# Altium footprint library AltiumDesignerLibraries.PcbLib: 313 footprints (part 17 of 20)
Each footprint in its own frame and in the unit in brackets; x right, y up, seen from the top. Pads: shape width x height; smd on the part's side, far side on the other; paste and mask are expansions set on the pad; w line width, h text height; cw(c..) or ccw(c..) is an arc to the next point about the centre after c.
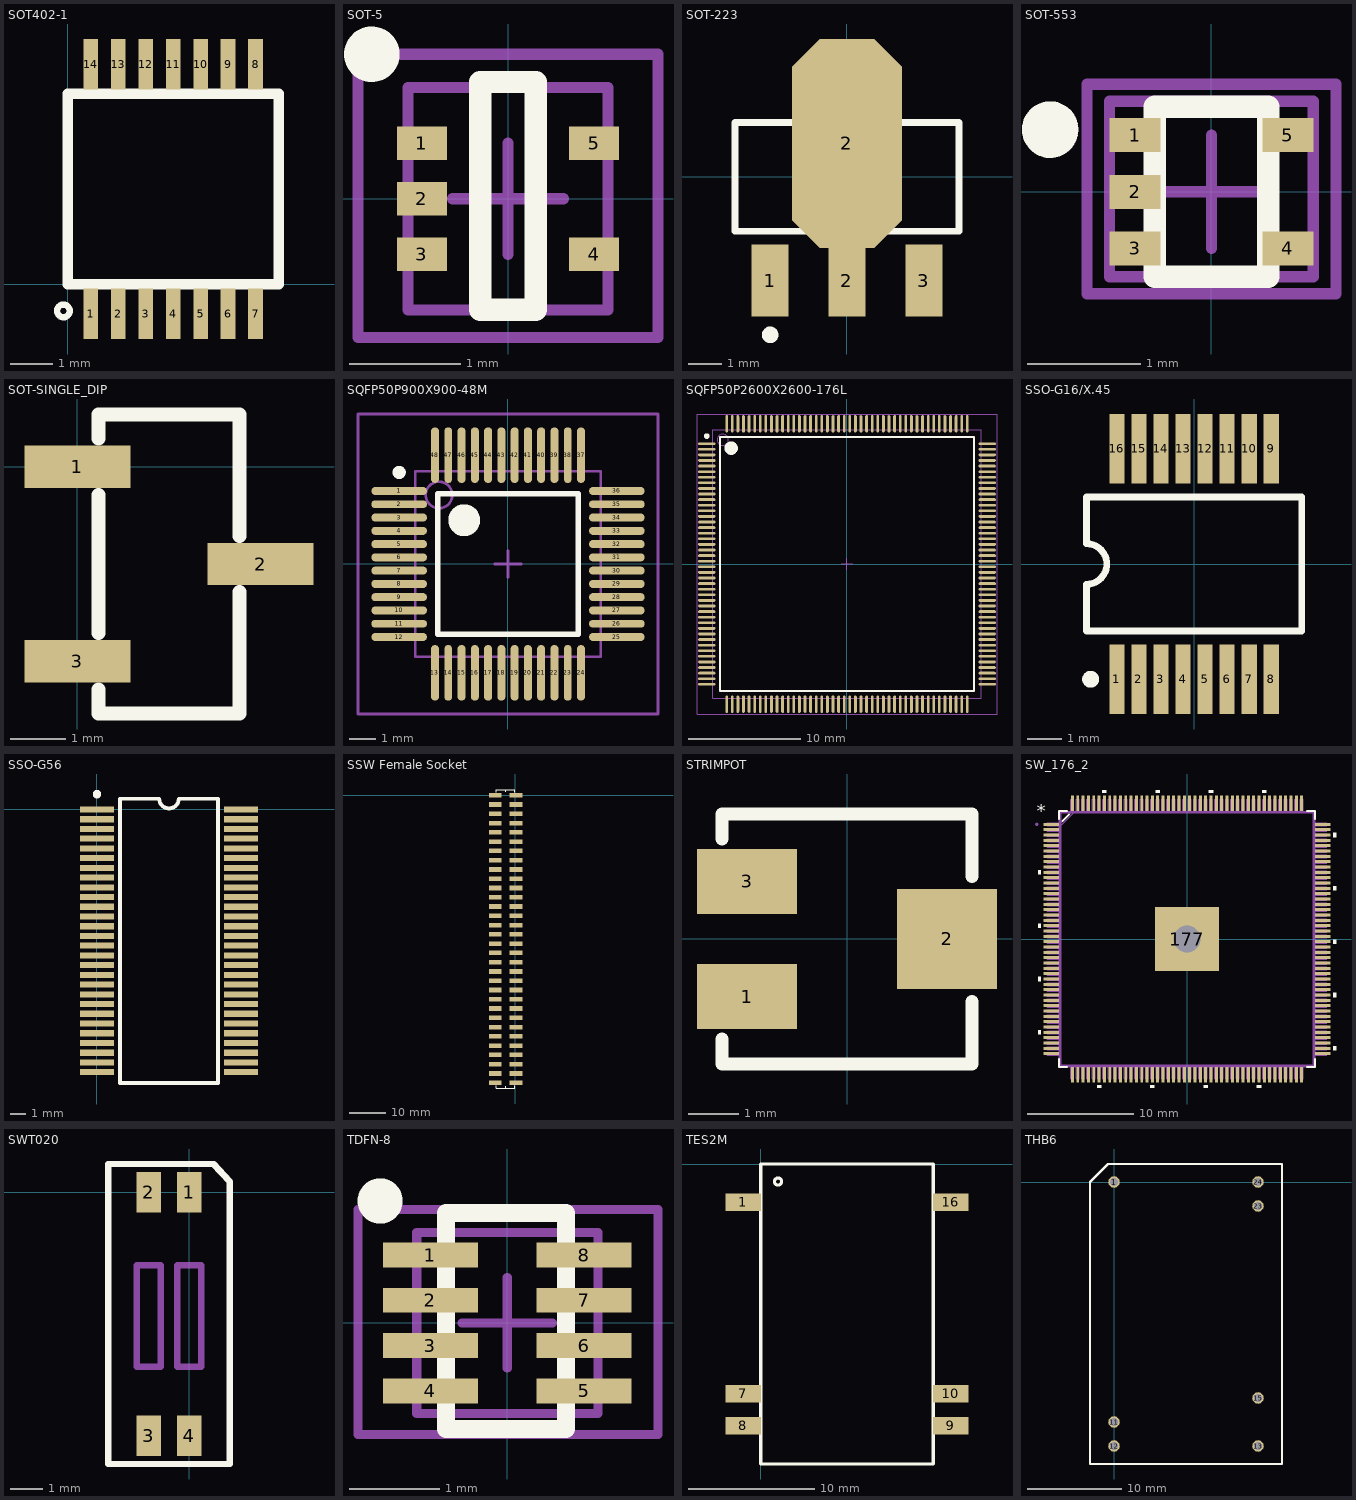
[diagram p16: the footprints below, top view; thin cyan lines are the x and y axes]

## SOT402-1 [mm]
pads (14):
  rect 0.35x1.2 smd: 1(0.55,-0.7) 2(1.2,-0.7) 3(1.85,-0.7) 4(2.5,-0.7) 5(3.15,-0.7) 6(3.8,-0.7) 7(4.45,-0.7) 8(4.45,5.2) 9(3.8,5.2) 10(3.15,5.2) 11(2.5,5.2) 12(1.85,5.2) 13(1.2,5.2) 14(0.55,5.2)
Top Overlay:
  circle w0.15: c-0.099,-0.635 r0.15
  lines w0.25: 0,0 5,0 5,4.5 0,4.5 0,0

## SOT-5 [mm] "SOT23, 5-Leads, Body 2.9x1.6mm, Pitch 0.95mm, Lead Span 2.8mm, IPC Medium Density"
height 0.6
pads (5):
  rect 0.45x0.3 smd: 1(-0.775,0.5) 2(-0.775,0) 3(-0.775,-0.5) 4(0.775,-0.5) 5(0.775,0.5)
Top Overlay:
  circle w0.25: c-1.225,1.3 r0.125
  lines w0.2: -0.25,-1 0.25,-1 0.25,1.05 -0.25,1.05 -0.25,-1
Mechanical 13:
  lines w0.1: -0.9,-1 0.9,-1 0.9,1 -0.9,1 -0.9,-1
Mechanical 15:
  lines w0.1: -0.5,0 0.5,0 ; 0,-0.5 0,0.5 ; -1.35,-1.25 -1.35,1.3 1.35,1.3 1.35,-1.25 -1.35,-1.25
3D body: height 0.6, standoff 0, extent -0.9,-1 0.9,1

## SOT-223 [mm]
pads (4):
  rect 1.1x2.15 smd: 1(-2.3,-3.1) 2(0,-3.1) 3(2.3,-3.1)
  oct 3.3x6.25 smd: 2(0,1)
Top Overlay:
  circle w0.25: c-2.3,-4.725 r0.125
  lines w0.2: -3.35,-1.625 -3.35,1.625 3.35,1.625 3.35,-1.625 -3.35,-1.625

## SOT-553 [mm] "SOT-553"
height 0.5
pads (5):
  rect 0.45x0.3 smd: 1(-0.675,0.5) 2(-0.675,0) 3(-0.675,-0.5) 4(0.675,-0.5) 5(0.675,0.5)
Top Overlay:
  circle w0.25: c-1.425,0.55 r0.125
  lines w0.2: -0.5,-0.75 -0.5,0.75 0.5,0.75 0.5,-0.75 -0.5,-0.75
Mechanical 13:
  lines w0.1: -0.9,-0.75 0.9,-0.75 0.9,0.8 -0.9,0.8 -0.9,-0.75
Mechanical 15:
  lines w0.1: -0.5,0 0.5,0 ; 0,-0.5 0,0.5 ; -1.1,-0.9 1.1,-0.9 1.1,0.95 -1.1,0.95 -1.1,-0.9
3D body: height 1.45, standoff 0, extent -0.9,-0.8 0.9,0.85

## SOT-SINGLE_DIP [mil] "Mini-Dip switch"
pads (3):
  rect 75x30 smd: 1(0,0) 2(130,-69) 3(0,-138)
Top Overlay:
  lines w10: 15,-158 15,-175 115,-175 115,-89 ; 15,-118 15,-20 ; 15,20 15,37 115,37 115,-49

## SQFP50P900X900-48M [mm] "Shrink QFP, 48-Leads, Body 7x7mm, Pitch 0.5mm, IPC Low Density"
height 1.7
pads (48):
  oval 2.1x0.3 smd: 1(-4.1,2.75) 2(-4.1,2.25) 3(-4.1,1.75) 4(-4.1,1.25) 5(-4.1,0.75) 6(-4.1,0.25) 7(-4.1,-0.25) 8(-4.1,-0.75) 9(-4.1,-1.25) 10(-4.1,-1.75) 11(-4.1,-2.25) 12(-4.1,-2.75) 25(4.1,-2.75) 26(4.1,-2.25) 27(4.1,-1.75) 28(4.1,-1.25) 29(4.1,-0.75) 30(4.1,-0.25) 31(4.1,0.25) 32(4.1,0.75) 33(4.1,1.25) 34(4.1,1.75) 35(4.1,2.25) 36(4.1,2.75)
  oval 0.3x2.1 smd: 13(-2.75,-4.1) 14(-2.25,-4.1) 15(-1.75,-4.1) 16(-1.25,-4.1) 17(-0.75,-4.1) 18(-0.25,-4.1) 19(0.25,-4.1) 20(0.75,-4.1) 21(1.25,-4.1) 22(1.75,-4.1) 23(2.25,-4.1) 24(2.75,-4.1) 37(2.75,4.1) 38(2.25,4.1) 39(1.75,4.1) 40(1.25,4.1) 41(0.75,4.1) 42(0.25,4.1) 43(-0.25,4.1) 44(-0.75,4.1) 45(-1.25,4.1) 46(-1.75,4.1) 47(-2.25,4.1) 48(-2.75,4.1)
Top Overlay:
  circle w0.25: c-4.1,3.45 r0.125
  circle w0.6: c-1.65,1.65 r0.3
  lines w0.2: -2.65,-2.65 -2.65,2.65 2.65,2.65 2.65,-2.65 -2.65,-2.65
Mechanical 13:
  circle w0.1: c-2.6,2.6 r0.5
  lines w0.1: -3.5,-3.5 -3.5,3.5 3.5,3.5 3.5,-3.5 -3.5,-3.5
Mechanical 15:
  lines w0.1: -0.5,0 0.5,0 ; 0,-0.5 0,0.5 ; -5.65,-5.65 -5.65,5.65 5.65,5.65 5.65,-5.65 -5.65,-5.65
3D body: height 1.7, standoff 0, extent -3.5,-3.5 3.5,3.5

## SQFP50P2600X2600-176L [mm] "Shrink QFP, 176-Leads, Body 24x24mm, Pitch 0.5mm, IPC High Density"
height 3.2
pads (176):
  oval 1.55x0.25 smd: 1(-12.525,10.75) 2(-12.525,10.25) 3(-12.525,9.75) 4(-12.525,9.25) 5(-12.525,8.75) 6(-12.525,8.25) 7(-12.525,7.75) 8(-12.525,7.25) 9(-12.525,6.75) 10(-12.525,6.25) 11(-12.525,5.75) 12(-12.525,5.25) 13(-12.525,4.75) 14(-12.525,4.25) 15(-12.525,3.75) 16(-12.525,3.25) 17(-12.525,2.75) 18(-12.525,2.25) 19(-12.525,1.75) 20(-12.525,1.25) 21(-12.525,0.75) 22(-12.525,0.25) 23(-12.525,-0.25) 24(-12.525,-0.75) 25(-12.525,-1.25) 26(-12.525,-1.75) 27(-12.525,-2.25) 28(-12.525,-2.75) 29(-12.525,-3.25) 30(-12.525,-3.75) 31(-12.525,-4.25) 32(-12.525,-4.75) 33(-12.525,-5.25) 34(-12.525,-5.75) 35(-12.525,-6.25) 36(-12.525,-6.75) 37(-12.525,-7.25) 38(-12.525,-7.75) 39(-12.525,-8.25) 40(-12.525,-8.75) 41(-12.525,-9.25) 42(-12.525,-9.75) 43(-12.525,-10.25) 44(-12.525,-10.75) 89(12.525,-10.75) 90(12.525,-10.25) 91(12.525,-9.75) 92(12.525,-9.25) 93(12.525,-8.75) 94(12.525,-8.25) 95(12.525,-7.75) 96(12.525,-7.25) 97(12.525,-6.75) 98(12.525,-6.25) 99(12.525,-5.75) 100(12.525,-5.25) 101(12.525,-4.75) 102(12.525,-4.25) 103(12.525,-3.75) 104(12.525,-3.25) 105(12.525,-2.75) 106(12.525,-2.25) 107(12.525,-1.75) 108(12.525,-1.25) 109(12.525,-0.75) 110(12.525,-0.25) 111(12.525,0.25) 112(12.525,0.75) 113(12.525,1.25) 114(12.525,1.75) 115(12.525,2.25) 116(12.525,2.75) 117(12.525,3.25) 118(12.525,3.75) 119(12.525,4.25) 120(12.525,4.75) 121(12.525,5.25) 122(12.525,5.75) 123(12.525,6.25) 124(12.525,6.75) 125(12.525,7.25) 126(12.525,7.75) 127(12.525,8.25) 128(12.525,8.75) 129(12.525,9.25) 130(12.525,9.75) 131(12.525,10.25) 132(12.525,10.75)
  oval 0.25x1.55 smd: 45(-10.75,-12.525) 46(-10.25,-12.525) 47(-9.75,-12.525) 48(-9.25,-12.525) 49(-8.75,-12.525) 50(-8.25,-12.525) 51(-7.75,-12.525) 52(-7.25,-12.525) 53(-6.75,-12.525) 54(-6.25,-12.525) 55(-5.75,-12.525) 56(-5.25,-12.525) 57(-4.75,-12.525) 58(-4.25,-12.525) 59(-3.75,-12.525) 60(-3.25,-12.525) 61(-2.75,-12.525) 62(-2.25,-12.525) 63(-1.75,-12.525) 64(-1.25,-12.525) 65(-0.75,-12.525) 66(-0.25,-12.525) 67(0.25,-12.525) 68(0.75,-12.525) 69(1.25,-12.525) 70(1.75,-12.525) 71(2.25,-12.525) 72(2.75,-12.525) 73(3.25,-12.525) 74(3.75,-12.525) 75(4.25,-12.525) 76(4.75,-12.525) 77(5.25,-12.525) 78(5.75,-12.525) 79(6.25,-12.525) 80(6.75,-12.525) 81(7.25,-12.525) 82(7.75,-12.525) 83(8.25,-12.525) 84(8.75,-12.525) 85(9.25,-12.525) 86(9.75,-12.525) 87(10.25,-12.525) 88(10.75,-12.525) 133(10.75,12.525) 134(10.25,12.525) 135(9.75,12.525) 136(9.25,12.525) 137(8.75,12.525) 138(8.25,12.525) 139(7.75,12.525) 140(7.25,12.525) 141(6.75,12.525) 142(6.25,12.525) 143(5.75,12.525) 144(5.25,12.525) 145(4.75,12.525) 146(4.25,12.525) 147(3.75,12.525) 148(3.25,12.525) 149(2.75,12.525) 150(2.25,12.525) 151(1.75,12.525) 152(1.25,12.525) 153(0.75,12.525) 154(0.25,12.525) 155(-0.25,12.525) 156(-0.75,12.525) 157(-1.25,12.525) 158(-1.75,12.525) 159(-2.25,12.525) 160(-2.75,12.525) 161(-3.25,12.525) 162(-3.75,12.525) 163(-4.25,12.525) 164(-4.75,12.525) 165(-5.25,12.525) 166(-5.75,12.525) 167(-6.25,12.525) 168(-6.75,12.525) 169(-7.25,12.525) 170(-7.75,12.525) 171(-8.25,12.525) 172(-8.75,12.525) 173(-9.25,12.525) 174(-9.75,12.525) 175(-10.25,12.525) 176(-10.75,12.525)
Top Overlay:
  circle w0.25: c-12.525,11.425 r0.125
  circle w0.6: c-10.35,10.35 r0.3
  lines w0.2: -11.35,-11.35 -11.35,11.35 11.35,11.35 11.35,-11.35 -11.35,-11.35
Mechanical 13:
  circle w0.1: c-11.1,11.1 r0.5
  lines w0.1: -12,-12 -12,12 12,12 12,-12 -12,-12
Mechanical 15:
  lines w0.1: -0.5,0 0.5,0 ; 0,-0.5 0,0.5 ; -13.4,-13.4 -13.4,13.4 13.4,13.4 13.4,-13.4 -13.4,-13.4
3D body: height 3.2, standoff 0, extent -12,-12 12,12

## SSO-G16/X.45 [mm]
pads (16):
  rect 0.45x2.05 smd: 1(-2.275,-3.4) 2(-1.625,-3.4) 3(-0.975,-3.4) 4(-0.325,-3.4) 5(0.325,-3.4) 6(0.975,-3.4) 7(1.625,-3.4) 8(2.275,-3.4) 9(2.275,3.4) 10(1.625,3.4) 11(0.975,3.4) 12(0.325,3.4) 13(-0.325,3.4) 14(-0.975,3.4) 15(-1.625,3.4) 16(-2.275,3.4)
Top Overlay:
  circle w0.25: c-3.05,-3.4 r0.125
  lines w0.2: -3.175,-0.625 -3.175,-1.975 3.175,-1.975 3.175,1.975 -3.175,1.975 -3.175,0.625 ; -3.175,-0.6 ccw(c-3.175,0) -3.175,0.6

## SSO-G56 [mm]
pads (56):
  rect 2.2x0.4 smd: 1(0,0) 2(0,-0.635) 3(0,-1.27) 4(0,-1.905) 5(0,-2.54) 6(0,-3.175) 7(0,-3.81) 8(0,-4.445) 9(0,-5.08) 10(0,-5.715) 11(0,-6.35) 12(0,-6.985) 13(0,-7.62) 14(0,-8.255) 15(0,-8.89) 16(0,-9.525) 17(0,-10.16) 18(0,-10.795) 19(0,-11.43) 20(0,-12.065) 21(0,-12.7) 22(0,-13.335) 23(0,-13.97) 24(0,-14.605) 25(0,-15.24) 26(0,-15.875) 27(0,-16.51) 28(0,-17.145) 29(9.4,-17.145) 30(9.4,-16.51) 31(9.4,-15.875) 32(9.4,-15.24) 33(9.4,-14.605) 34(9.4,-13.97) 35(9.4,-13.335) 36(9.4,-12.7) 37(9.4,-12.065) 38(9.4,-11.43) 39(9.4,-10.795) 40(9.4,-10.16) 41(9.4,-9.525) 42(9.4,-8.89) 43(9.4,-8.255) 44(9.4,-7.62) 45(9.4,-6.985) 46(9.4,-6.35) 47(9.4,-5.715) 48(9.4,-5.08) 49(9.4,-4.445) 50(9.4,-3.81) 51(9.4,-3.175) 52(9.4,-2.54) 53(9.4,-1.905) 54(9.4,-1.27) 55(9.4,-0.635) 56(9.4,0)
Top Overlay:
  circle w0.25: c0,1 r0.15
  lines w0.25: 1.5,-17.848 7.9,-17.848 7.9,0.702 5.335,0.702 cw(c4.7,0.702) 4.065,0.702 1.5,0.702 1.5,-17.848

## SSW Female Socket [mil]
pads (64):
  rect 135x50 smd: 1(10,0) 2(10,-100) 3(10,-200) 4(10,-300) 5(10,-400) 6(10,-500) 7(10,-600) 8(10,-700) 9(10,-800) 10(10,-900) 11(10,-1000) 12(10,-1100) 13(10,-1200) 14(10,-1300) 15(10,-1400) 16(10,-1500) 17(10,-1600) 18(10,-1700) 19(10,-1800) 20(10,-1900) 21(10,-2000) 22(10,-2100) 23(10,-2200) 24(10,-2300) 25(10,-2400) 26(10,-2500) 27(10,-2600) 28(10,-2700) 29(10,-2800) 30(10,-2900) 31(10,-3000) 32(10,-3100) 33(-215,0) 34(-215,-100) 35(-215,-200) 36(-215,-300) 37(-215,-400) 38(-215,-500) 39(-215,-600) 40(-215,-700) 41(-215,-800) 42(-215,-900) 43(-215,-1000) 44(-215,-1100) 45(-215,-1200) 46(-215,-1300) 47(-215,-1400) 48(-215,-1500) 49(-215,-1600) 50(-215,-1700) 51(-215,-1800) 52(-215,-1900) 53(-215,-2000) 54(-215,-2100) 55(-215,-2200) 56(-215,-2300) 57(-215,-2400) 58(-215,-2500) 59(-215,-2600) 60(-215,-2700) 61(-215,-2800) 62(-215,-2900) 63(-215,-3000) 64(-215,-3100)
Top Overlay:
  lines w10: -200.5,-3130.5 -200.5,-3160 -103,-3160 ; -200.5,30 -200.5,60 -103,60 ; -103,-3137 -103,-3160 ; -103,37 -103,60 ; -5.5,-3130.5 -5.5,-3160 -103,-3160 ; -5.5,30 -5.5,60 -103,60

## STRIMPOT [mm] "4MM-2"
pads (3):
  rect 2x1.3 smd: 1(-2,-1.15) 3(-2,1.15)
  rect 2x2 smd: 2(2,0)
Top Overlay:
  lines w0.254: -2.5,-2 -2.5,-2.5 2.5,-2.5 2.5,-1.25 ; -2.5,2 -2.5,2.5 2.5,2.5 2.5,1.25

## SW_176_2 [mil]
height 57
pads (177):
  rect 58x10.63 smd: 1(-501,423.23) 2(-501,403.54) 3(-501,383.86) 4(-501,364.17) 5(-501,344.49) 6(-501,324.8) 7(-501,305.12) 8(-501,285.43) 9(-501,265.75) 10(-501,246.06) 11(-501,226.38) 12(-501,206.69) 13(-501,187.01) 14(-501,167.32) 15(-501,147.64) 16(-501,127.95) 17(-501,108.27) 18(-501,88.58) 19(-501,68.9) 20(-501,49.21) 21(-501,29.53) 22(-501,9.84) 23(-501,-9.84) 24(-501,-29.53) 25(-501,-49.21) 26(-501,-68.9) 27(-501,-88.58) 28(-501,-108.27) 29(-501,-127.95) 30(-501,-147.64) 31(-501,-167.32) 32(-501,-187.01) 33(-501,-206.69) 34(-501,-226.38) 35(-501,-246.06) 36(-501,-265.75) 37(-501,-285.43) 38(-501,-305.12) 39(-501,-324.8) 40(-501,-344.49) 41(-501,-364.17) 42(-501,-383.86) 43(-501,-403.54) 44(-501,-423.23) 89(501,-423.23) 90(501,-403.54) 91(501,-383.86) 92(501,-364.17) 93(501,-344.49) 94(501,-324.8) 95(501,-305.12) 96(501,-285.43) 97(501,-265.75) 98(501,-246.06) 99(501,-226.38) 100(501,-206.69) 101(501,-187.01) 102(501,-167.32) 103(501,-147.64) 104(501,-127.95) 105(501,-108.27) 106(501,-88.58) 107(501,-68.9) 108(501,-49.21) 109(501,-29.53) 110(501,-9.84) 111(501,9.84) 112(501,29.53) 113(501,49.21) 114(501,68.9) 115(501,88.58) 116(501,108.27) 117(501,127.95) 118(501,147.64) 119(501,167.32) 120(501,187.01) 121(501,206.69) 122(501,226.38) 123(501,246.06) 124(501,265.75) 125(501,285.43) 126(501,305.12) 127(501,324.8) 128(501,344.49) 129(501,364.17) 130(501,383.86) 131(501,403.54) 132(501,423.23)
  rect 10.63x58 smd: 45(-423.23,-501) 46(-403.54,-501) 47(-383.86,-501) 48(-364.17,-501) 49(-344.49,-501) 50(-324.8,-501) 51(-305.12,-501) 52(-285.43,-501) 53(-265.75,-501) 54(-246.06,-501) 55(-226.38,-501) 56(-206.69,-501) 57(-187.01,-501) 58(-167.32,-501) 59(-147.64,-501) 60(-127.95,-501) 61(-108.27,-501) 62(-88.58,-501) 63(-68.9,-501) 64(-49.21,-501) 65(-29.53,-501) 66(-9.84,-501) 67(9.84,-501) 68(29.53,-501) 69(49.21,-501) 70(68.9,-501) 71(88.58,-501) 72(108.27,-501) 73(127.95,-501) 74(147.64,-501) 75(167.32,-501) 76(187.01,-501) 77(206.69,-501) 78(226.38,-501) 79(246.06,-501) 80(265.75,-501) 81(285.43,-501) 82(305.12,-501) 83(324.8,-501) 84(344.49,-501) 85(364.17,-501) 86(383.86,-501) 87(403.54,-501) 88(423.23,-501) 133(423.23,501) 134(403.54,501) 135(383.86,501) 136(364.17,501) 137(344.49,501) 138(324.8,501) 139(305.12,501) 140(285.43,501) 141(265.75,501) 142(246.06,501) 143(226.38,501) 144(206.69,501) 145(187.01,501) 146(167.32,501) 147(147.64,501) 148(127.95,501) 149(108.27,501) 150(88.58,501) 151(68.9,501) 152(49.21,501) 153(29.53,501) 154(9.84,501) 155(-9.84,501) 156(-29.53,501) 157(-49.21,501) 158(-68.9,501) 159(-88.58,501) 160(-108.27,501) 161(-127.95,501) 162(-147.64,501) 163(-167.32,501) 164(-187.01,501) 165(-206.69,501) 166(-226.38,501) 167(-246.06,501) 168(-265.75,501) 169(-285.43,501) 170(-305.12,501) 171(-324.8,501) 172(-344.49,501) 173(-364.17,501) 174(-383.86,501) 175(-403.54,501) 176(-423.23,501)
  rect 236x236 smd: 177(0,0)
via 0,0 diameter 125 hole 100
Top Overlay:
  region: -540,253.56 -550,253.56 -550,238.56 -540,238.56
  region: -540,56.71 -550,56.71 -550,41.71 -540,41.71
  region: -540,-140.14 -550,-140.14 -550,-155.14 -540,-155.14
  region: -540,-336.99 -550,-336.99 -550,-351.99 -540,-351.99
  region: -317.3,-540 -332.3,-540 -332.3,-550 -317.3,-550
  region: -120.45,-540 -135.45,-540 -135.45,-550 -120.45,-550
  region: 76.4,-540 61.4,-540 61.4,-550 76.4,-550
  region: 273.25,-540 258.25,-540 258.25,-550 273.25,-550
  region: 540,-396.04 550,-396.04 550,-411.04 540,-411.04
  region: 540,-199.19 550,-199.19 550,-214.19 540,-214.19
  region: 540,-2.34 550,-2.34 550,-17.34 540,-17.34
  region: 540,194.51 550,194.51 550,179.51 540,179.51
  region: 540,391.36 550,391.36 550,376.36 540,376.36
  region: 292.93,540 277.93,540 277.93,550 292.93,550
  region: 96.08,540 81.08,540 81.08,550 96.08,550
  region: -100.77,540 -115.77,540 -115.77,550 -100.77,550
  region: -297.62,540 -312.62,540 -312.62,550 -297.62,550
  lines w6: -472.5,-441.64 -472.5,-472.5 -441.64,-472.5 ; -472.5,441.64 -472.5,472.5 -441.64,472.5 ; -460.39,434.61 -434.61,460.39 ; 441.64,-472.5 472.5,-472.5 472.5,-441.64 ; 441.64,472.5 472.5,472.5 472.5,441.64
  text "*" at -555,448.07 h50
Mechanical 2:
  drawing of 715 lines, arcs and shapes, not listed
  text "*" at -555,448.07 h50
3D body: height 125.98, standoff 0, extent -471.44,-473.44 473.44,471.44

## SWT020 [mil] "DIP2"
pads (4):
  rect 30x50 smd mask+3: 1(0,0) 2(-50,0) 3(-50,-300) 4(0,-300)
Top Overlay:
  lines w8: -100,-335 50,-335 50,13 30,35 -100,35 -100,-335
Mechanical 2:
  lines w8: -65,-215 -35,-215 -35,-90 -65,-90 -65,-215 ; -15,-215 15,-215 15,-90 -15,-90 -15,-215

## TDFN-8 [mm]
height 0.75
pads (8):
  rect 1.05x0.275 smd: 1(-0.85,0.75) 2(-0.85,0.25) 3(-0.85,-0.25) 4(-0.85,-0.75) 5(0.85,-0.75) 6(0.85,-0.25) 7(0.85,0.25) 8(0.85,0.75)
Top Overlay:
  circle w0.25: c-1.405,1.347 r0.125
  lines w0.2: -0.676,-1.174 -0.676,1.213 0.648,1.213 0.648,-1.174 -0.676,-1.174
Mechanical 13:
  lines w0.1: -1,-1 1,-1 1,1 -1,1 -1,-1
Mechanical 15:
  lines w0.1: -0.5,0 0.5,0 ; 0,-0.5 0,0.5 ; -1.649,-1.235 1.665,-1.235 1.665,1.252 -1.649,1.252 -1.649,-1.235
3D body: height 0.75, standoff 0, extent -0.97,-1.006 0.986,1.004

## TES2M [mil]
pads (6):
  rect 110x55 smd: 1(-55,-120) 7(-55,-720) 8(-55,-820) 9(595,-820) 10(595,-720) 16(595,-120)
Top Overlay:
  circle w10: c53.82,-55 r11.18
  lines w10: 0,-940 0,0 540,0 540,-940 0,-940

## THB6 [mil]
pads (7):
  round 48 hole 32: 1(0,0) 11(0,-1000) 12(0,-1100) 13(600,-1100) 15(600,-900) 23(600,-100) 24(600,0)
Top Overlay:
  lines w10: -100,-1175 -100,0 -25,75 700,75 700,-1175 -100,-1175